# Altium footprint library Tomra_Cadstar_Footprints.PcbLib: 373 footprints (part 22 of 24)
Each footprint in its own frame and in the unit in brackets; x right, y up, seen from the top. Pads: shape width x height; smd on the part's side, far side on the other; paste and mask are expansions set on the pad; w line width, h text height; cw(c..) or ccw(c..) is an arc to the next point about the centre after c.
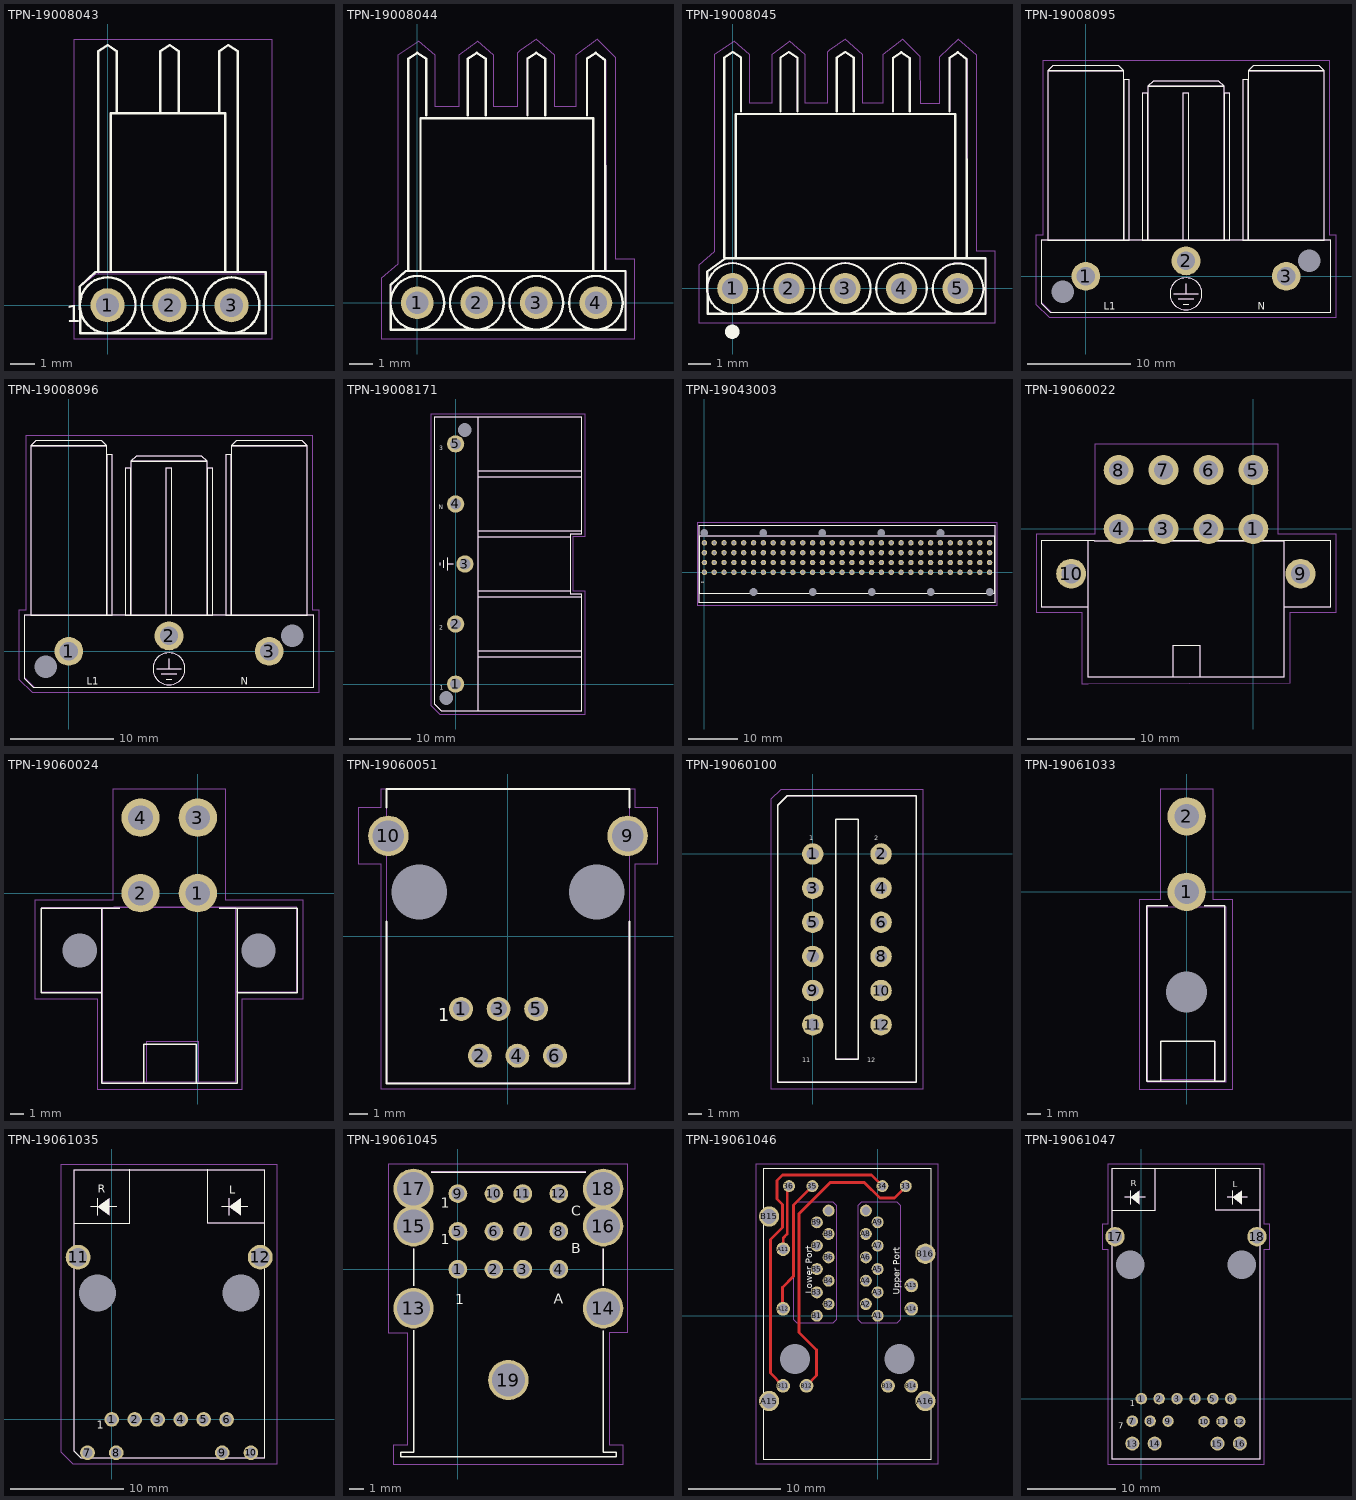
[diagram p21: the footprints below, top view; thin cyan lines are the x and y axes]

## TPN-19008043 [mm]
height 5.7
pads (3):
  round 1.4 / inner round 1.524 / far side round 1.4 hole 0.95 paste+0 mask+0: 1(0,0) 2(2.54,0) 3(5.08,0)
Top Silk:
  lines w0.1: -0.381,1.397 -0.381,10.414 0,10.668 0.381,10.414 0.381,7.874 ; 0.127,1.36 0.127,7.874 4.826,7.874 4.826,1.36 ; 2.159,7.914 2.159,10.414 2.54,10.668 2.921,10.414 2.921,7.914 ; 4.572,7.914 4.572,10.414 4.953,10.668 5.334,10.414 5.334,1.397 ; -1.143,0.762 -1.13,-1.143 6.477,-1.143 6.477,1.36 -0.495,1.36 -1.143,0.762 ; 0,-1.143 ccw(c0,0) 0,1.143 ccw(c0,0) 0,-1.143 ; 2.54,-1.143 ccw(c2.54,0) 2.54,1.143 ccw(c2.54,0) 2.54,-1.143 ; 5.08,-1.143 ccw(c5.08,0) 5.08,1.143 ccw(c5.08,0) 5.08,-1.143
  text "1" at -1.7,-0.7 h0.7
  text ".Designator" at -1.2,-2.4 h0.7
Top Assembly:
  lines w0.05: -0.381,1.314 -0.381,10.414 0,10.668 0.381,10.414 0.381,7.874 ; 0.127,1.36 0.127,7.874 4.826,7.874 4.826,1.36 ; 2.159,7.914 2.159,10.414 2.54,10.668 2.921,10.414 2.921,7.914 ; 4.572,7.914 4.572,10.414 4.953,10.668 5.334,10.414 5.334,1.314 ; 0,-1.143 ccw(c0,0) 0,1.143 ; 0,-1.143 cw(c0,0) 0,1.143 ; 0,-1.143 ccw(c0,0) 0,1.143 ; 0,-1.143 cw(c0,0) 0,1.143 ; 2.54,-1.143 ccw(c2.54,0) 2.54,1.143 ; 2.54,-1.143 cw(c2.54,0) 2.54,1.143 ; 2.54,-1.143 ccw(c2.54,0) 2.54,1.143 ; 2.54,-1.143 cw(c2.54,0) 2.54,1.143 ; 5.08,-1.143 ccw(c5.08,0) 5.08,1.143 ; 5.08,-1.143 cw(c5.08,0) 5.08,1.143 ; 5.08,-1.143 ccw(c5.08,0) 5.08,1.143 ; 5.08,-1.143 cw(c5.08,0) 5.08,1.143 ; -1.143,0.762 -0.495,1.27 6.477,1.27 6.477,-1.143 -1.13,-1.143 -1.143,0.762
  text "1" at -1.7,-0.7 h0.7
Top Placement:
  lines w0.01: -1.366,-1.386 -1.366,10.914 6.734,10.914 6.734,-1.386 -1.366,-1.386

## TPN-19008044 [mm]
pads (4):
  round 1.4 / inner round 1.524 / far side round 1.4 hole 0.95 paste+0 mask+0: 1(0,0) 2(2.54,0) 3(5.08,0) 4(7.62,0)
Top Silk:
  lines w0.1: 0.14,1.36 0.14,7.874 7.51,7.874 7.51,1.36 ; 7.239,8.001 7.239,10.414 7.62,10.668 8.01,10.36 8.019,1.431 ; -0.381,10.414 0,10.668 ; -0.381,10.414 -0.381,1.397 -0.381,10.414 ; -0.381,10.414 0,10.668 ; 0,-1.143 ccw(c0,0) 0,1.143 ; 0,-1.143 cw(c0,0) 0,1.143 ; 0,-1.143 ccw(c0,0) 0,1.143 ; 0,-1.143 cw(c0,0) 0,1.143 ; 0,10.668 0.381,10.414 ; 0,10.668 0.381,10.414 ; 0.381,10.414 0.381,8.001 0.381,10.414 ; 2.159,10.414 2.54,10.668 ; 2.159,10.414 2.159,8.001 2.159,10.414 ; 2.159,10.414 2.54,10.668 ; 2.54,-1.143 ccw(c2.54,0) 2.54,1.143 ; 2.54,-1.143 cw(c2.54,0) 2.54,1.143 ; 2.54,-1.143 ccw(c2.54,0) 2.54,1.143 ; 2.54,-1.143 cw(c2.54,0) 2.54,1.143 ; 2.54,10.668 2.921,10.414 ; 2.54,10.668 2.921,10.414 ; 2.921,10.414 2.921,8.001 2.921,10.414 ; 4.699,10.414 4.699,8.001 4.699,10.414 ; 4.699,10.414 5.08,10.668 ; 4.699,10.414 5.08,10.668 ; 5.08,-1.143 ccw(c5.08,0) 5.08,1.143 ; 5.08,-1.143 cw(c5.08,0) 5.08,1.143 ; 5.08,-1.143 ccw(c5.08,0) 5.08,1.143 ; 5.08,-1.143 cw(c5.08,0) 5.08,1.143 ; 5.08,10.668 5.461,10.414 ; 5.08,10.668 5.461,10.414 ; 5.461,10.414 5.461,8.001 5.461,10.414 ; 7.62,-1.143 ccw(c7.62,0) 7.62,1.143 ; 7.62,-1.143 cw(c7.62,0) 7.62,1.143 ; 7.62,-1.143 ccw(c7.62,0) 7.62,1.143 ; 7.62,-1.143 cw(c7.62,0) 7.62,1.143 ; -1.143,0.762 -1.13,-1.143 8.885,-1.143 8.885,1.36 -0.495,1.36 -1.143,0.762
  text ".Designator" at 0,0 h0.7
Top Assembly:
  lines w0.05: 7.26,7.985 7.26,10.398 7.641,10.652 8.031,10.344 8.04,1.415 ; -1.143,0.762 -0.495,1.36 ; -1.143,0.762 -1.13,-1.143 ; -1.143,0.762 -1.13,-1.143 ; -1.143,0.762 -0.495,1.36 ; -1.13,-1.143 8.885,-1.143 ; -1.13,-1.143 8.885,-1.143 ; -0.495,1.36 8.885,1.36 ; -0.495,1.36 8.885,1.36 ; -0.381,10.414 0,10.668 ; -0.381,10.414 -0.381,1.397 -0.381,10.414 ; -0.381,10.414 0,10.668 ; 0,-1.143 ccw(c0,0) 0,1.143 ; 0,-1.143 cw(c0,0) 0,1.143 ; 0,-1.143 ccw(c0,0) 0,1.143 ; 0,-1.143 cw(c0,0) 0,1.143 ; 0,10.668 0.381,10.414 ; 0,10.668 0.381,10.414 ; 0.14,7.874 0.14,1.36 0.14,7.874 ; 0.14,7.874 7.51,7.874 ; 0.14,7.874 7.51,7.874 ; 0.381,10.414 0.381,8.001 0.381,10.414 ; 2.159,10.414 2.54,10.668 ; 2.159,10.414 2.159,8.001 2.159,10.414 ; 2.159,10.414 2.54,10.668 ; 2.54,-1.143 ccw(c2.54,0) 2.54,1.143 ; 2.54,-1.143 cw(c2.54,0) 2.54,1.143 ; 2.54,-1.143 ccw(c2.54,0) 2.54,1.143 ; 2.54,-1.143 cw(c2.54,0) 2.54,1.143 ; 2.54,10.668 2.921,10.414 ; 2.54,10.668 2.921,10.414 ; 2.921,10.414 2.921,8.001 2.921,10.414 ; 4.699,10.414 4.699,8.001 4.699,10.414 ; 4.699,10.414 5.08,10.668 ; 4.699,10.414 5.08,10.668 ; 5.08,-1.143 ccw(c5.08,0) 5.08,1.143 ; 5.08,-1.143 cw(c5.08,0) 5.08,1.143 ; 5.08,-1.143 ccw(c5.08,0) 5.08,1.143 ; 5.08,-1.143 cw(c5.08,0) 5.08,1.143 ; 5.08,10.668 5.461,10.414 ; 5.08,10.668 5.461,10.414 ; 5.461,10.414 5.461,8.001 5.461,10.414 ; 7.51,7.874 7.51,1.36 7.51,7.874 ; 7.62,-1.143 ccw(c7.62,0) 7.62,1.143 ; 7.62,-1.143 cw(c7.62,0) 7.62,1.143 ; 7.62,-1.143 ccw(c7.62,0) 7.62,1.143 ; 7.62,-1.143 cw(c7.62,0) 7.62,1.143 ; 8.885,-1.143 8.885,1.36 ; 8.885,-1.143 8.885,1.36
  text "1" at -2.286,-0.889 h0.7
  text "1" at -2.286,-0.889 h0.7
  text "1" at -2.286,-0.889 h0.7
Top Placement:
  lines w0.01: -1.53,-1.543 9.27,-1.543 9.27,1.857 8.47,1.857 8.47,10.457 7.67,11.257 6.77,10.557 6.77,8.357 5.87,8.357 5.87,10.557 5.07,11.257 4.37,10.757 4.27,10.657 4.27,8.357 3.27,8.357 3.27,10.557 2.57,11.157 1.77,10.557 1.77,8.357 0.77,8.357 0.77,10.557 0.07,11.157 -0.83,10.557 -0.83,1.657 -1.53,1.057 -1.53,-1.543
  text "AMP" at 2.51,5.61 h0.7
  text "4" at 5.26,3.485 h0.7
  text "MTA" at 1.26,3.485 h0.7

## TPN-19008045 [mm]
pads (5):
  round 1.4 / inner round 1.524 / far side round 1.4 hole 0.95 paste+0 mask+0: 1(0,0) 2(2.54,0) 3(5.08,0) 4(7.62,0) 5(10.16,0)
Top Silk:
  region: -0.02,-2.28 -0.084,-2.28 -0.201,-2.231 -0.291,-2.141 -0.34,-2.024 -0.34,-1.896 -0.291,-1.779 -0.201,-1.689 -0.084,-1.64 -0.02,-1.64 0.044,-1.64 0.161,-1.689 0.251,-1.779 0.3,-1.896 0.3,-2.024 0.251,-2.141 0.161,-2.231 0.044,-2.28
  lines w0.1: 0.14,1.36 0.14,7.874 10.04,7.874 10.04,1.36 ; 4.699,8.001 4.699,10.414 5.08,10.668 5.461,10.414 5.461,8.001 ; 7.23,7.99 7.23,10.403 7.611,10.657 7.992,10.403 7.992,7.99 ; 9.78,7.99 9.78,10.403 10.161,10.657 10.551,10.349 10.56,1.42 ; -0.381,10.414 0,10.668 ; -0.381,10.414 -0.381,1.397 -0.381,10.414 ; -0.381,10.414 0,10.668 ; 0,-1.143 ccw(c0,0) 0,1.143 ; 0,-1.143 cw(c0,0) 0,1.143 ; 0,-1.143 ccw(c0,0) 0,1.143 ; 0,-1.143 cw(c0,0) 0,1.143 ; 0,10.668 0.381,10.414 ; 0,10.668 0.381,10.414 ; 0.381,10.414 0.381,8.001 0.381,10.414 ; 2.159,10.414 2.54,10.668 ; 2.159,10.414 2.159,8.001 2.159,10.414 ; 2.159,10.414 2.54,10.668 ; 2.54,-1.143 ccw(c2.54,0) 2.54,1.143 ; 2.54,-1.143 cw(c2.54,0) 2.54,1.143 ; 2.54,-1.143 ccw(c2.54,0) 2.54,1.143 ; 2.54,-1.143 cw(c2.54,0) 2.54,1.143 ; 2.54,10.668 2.921,10.414 ; 2.54,10.668 2.921,10.414 ; 2.921,10.414 2.921,8.001 2.921,10.414 ; 5.08,-1.143 ccw(c5.08,0) 5.08,1.143 ; 5.08,-1.143 cw(c5.08,0) 5.08,1.143 ; 5.08,-1.143 ccw(c5.08,0) 5.08,1.143 ; 5.08,-1.143 cw(c5.08,0) 5.08,1.143 ; 7.62,-1.143 ccw(c7.62,0) 7.62,1.143 ; 7.62,-1.143 cw(c7.62,0) 7.62,1.143 ; 7.62,-1.143 ccw(c7.62,0) 7.62,1.143 ; 7.62,-1.143 cw(c7.62,0) 7.62,1.143 ; -1.143,0.762 -1.127,-1.143 11.41,-1.143 11.41,1.36 -0.332,1.36 -1.143,0.762 ; 10.17,-1.153 ccw(c10.17,-0.01) 10.17,1.133 ccw(c10.17,-0.01) 10.17,-1.153
  text ".Designator" at 0,0 h0.7
Top Assembly:
  lines w0.05: 0.14,1.36 0.14,7.874 10.01,7.874 10.01,1.36 ; 7.23,7.99 7.23,10.403 7.611,10.657 7.992,10.403 7.992,7.99 ; 9.81,7.99 9.81,10.403 10.191,10.657 10.581,10.349 10.59,1.42 ; -1.143,0.762 -0.332,1.36 ; -1.143,0.762 -1.127,-1.143 ; -1.143,0.762 -1.127,-1.143 ; -1.143,0.762 -0.332,1.36 ; -1.127,-1.143 11.41,-1.143 ; -1.127,-1.143 11.41,-1.143 ; -0.381,10.414 0,10.668 ; -0.381,10.414 -0.381,1.397 -0.381,10.414 ; -0.381,10.414 0,10.668 ; -0.332,1.36 11.41,1.36 ; -0.332,1.36 11.41,1.36 ; 0,-1.143 ccw(c0,0) 0,1.143 ; 0,-1.143 cw(c0,0) 0,1.143 ; 0,-1.143 ccw(c0,0) 0,1.143 ; 0,-1.143 cw(c0,0) 0,1.143 ; 0,10.668 0.381,10.414 ; 0,10.668 0.381,10.414 ; 0.381,10.414 0.381,8.001 0.381,10.414 ; 2.159,10.414 2.54,10.668 ; 2.159,10.414 2.159,8.001 2.159,10.414 ; 2.159,10.414 2.54,10.668 ; 2.54,-1.143 ccw(c2.54,0) 2.54,1.143 ; 2.54,-1.143 cw(c2.54,0) 2.54,1.143 ; 2.54,-1.143 ccw(c2.54,0) 2.54,1.143 ; 2.54,-1.143 cw(c2.54,0) 2.54,1.143 ; 2.54,10.668 2.921,10.414 ; 2.54,10.668 2.921,10.414 ; 2.921,10.414 2.921,8.001 2.921,10.414 ; 4.699,10.414 4.699,8.001 4.699,10.414 ; 4.699,10.414 5.08,10.668 ; 4.699,10.414 5.08,10.668 ; 5.08,-1.143 ccw(c5.08,0) 5.08,1.143 ; 5.08,-1.143 cw(c5.08,0) 5.08,1.143 ; 5.08,-1.143 ccw(c5.08,0) 5.08,1.143 ; 5.08,-1.143 cw(c5.08,0) 5.08,1.143 ; 5.08,10.668 5.461,10.414 ; 5.08,10.668 5.461,10.414 ; 5.461,10.414 5.461,8.001 5.461,10.414 ; 7.62,-1.143 ccw(c7.62,0) 7.62,1.143 ; 7.62,-1.143 cw(c7.62,0) 7.62,1.143 ; 7.62,-1.143 ccw(c7.62,0) 7.62,1.143 ; 7.62,-1.143 cw(c7.62,0) 7.62,1.143 ; 11.41,-1.143 11.41,1.36 ; 11.41,-1.143 11.41,1.36 ; 10.16,-1.143 ccw(c10.16,0) 10.16,1.143 ccw(c10.16,0) 10.16,-1.143
  text "1" at -2.286,-0.889 h0.7
  text "1" at -2.286,-0.889 h0.7
  text "1" at -2.286,-0.889 h0.7
Top Placement:
  lines w0.01: -1.53,-1.543 11.85,-1.55 11.85,1.68 11.02,1.68 11.02,10.53 10.17,11.24 9.32,10.44 9.32,8.33 8.48,8.33 8.47,10.457 7.67,11.257 6.77,10.557 6.77,8.357 5.87,8.357 5.87,10.557 5.07,11.257 4.37,10.757 4.27,10.657 4.27,8.357 3.27,8.357 3.27,10.557 2.57,11.157 1.77,10.557 1.77,8.357 0.77,8.357 0.77,10.557 0.07,11.157 -0.83,10.557 -0.83,1.657 -1.53,1.057 -1.53,-1.543
  text "AMP" at 3.57,5.69 h0.7
  text "5" at 6.58,3.57 h0.7
  text "MTA" at 2.32,3.61 h0.7

## TPN-19008095 [mm]
height 13
pads (5):
  round 2.8 / inner round 1.524 / far side round 2.8 hole 1.8 paste+0 mask+0: 1(0,0) 2(9.75,1.5) 3(19.5,0)
  round 0 / inner round 1.524 / far side round 0 hole 2.2 unplated paste+0 mask+0: 4(-2.25,-1.5) 5(21.75,1.5)
Top Silk:
  lines w0.1: 8.55,-1.7 10.95,-1.7 ; 9,-2.2 10.5,-2.2 ; 9.5,-2.7 10,-2.7 ; 9.75,-1.7 9.75,-0.7 ; -3.7,20 3.7,20 ; -3.7,20 -3.7,3.5 3.7,3.5 ; -3.7,20 -3.2,20.5 3.2,20.5 3.7,20 ; -3.7,20 3.7,20 ; 3.7,3.5 3.7,20 ; 3.7,3.5 3.7,19.15 4.25,19.15 4.25,3.5 3.7,3.5 ; 6.05,3.5 6.05,18.5 ; 6.05,3.5 13.45,3.5 ; 6.05,3.5 6.05,17.8 5.5,17.8 5.5,3.5 6.05,3.5 ; 6.05,18.5 13.45,18.5 ; 6.05,18.5 6.55,19 12.95,19 13.45,18.5 ; 6.05,18.5 13.45,18.5 ; 13.45,3.5 13.45,18.5 ; 13.45,3.5 13.45,17.8 14,17.8 14,3.5 13.45,3.5 ; 15.8,3.5 15.8,19.15 15.25,19.15 15.25,3.5 15.8,3.5 ; 15.8,3.5 15.8,20 ; 15.8,3.5 23.2,3.5 23.2,20 ; 15.8,20 16.3,20.5 22.7,20.5 23.2,20 ; 15.8,20 23.2,20 ; 15.8,20 23.2,20 ; -4.35,-2.6 -4.35,3.5 23.85,3.5 23.85,-3.5 -3.45,-3.5 -4.35,-2.6 ; 9.45,3.5 9.45,17.8 10,17.8 10,3.5 9.45,3.5 ; 9.75,-3.25 cw(c9.75,-1.7) 9.75,-0.15 cw(c9.75,-1.7) 9.75,-3.25
  text "L1" at 1.75,-3.25 h0.7
  text "N" at 16.75,-3.25 h0.7
  text ".Designator" at 0,0 h0.7
Top Assembly:
  lines w0.05: 8.55,-1.7 10.95,-1.7 ; 9,-2.2 10.5,-2.2 ; 9.5,-2.7 10,-2.7 ; 9.75,-1.7 9.75,-0.7 ; -3.7,20 3.7,20 ; -3.7,20 -3.7,3.5 3.7,3.5 ; -3.7,20 -3.2,20.5 3.2,20.5 3.7,20 ; -3.7,20 3.7,20 ; 3.7,3.5 3.7,19.15 4.25,19.15 4.25,3.5 3.7,3.5 ; 3.7,3.5 3.7,20 ; 6.05,3.5 6.05,18.5 ; 6.05,3.5 13.45,3.5 ; 6.05,3.5 6.05,17.8 5.5,17.8 5.5,3.5 6.05,3.5 ; 6.05,18.5 13.45,18.5 ; 6.05,18.5 6.55,19 12.95,19 13.45,18.5 ; 6.05,18.5 13.45,18.5 ; 13.45,3.5 13.45,18.5 ; 13.45,3.5 13.45,17.8 14,17.8 14,3.5 13.45,3.5 ; 15.8,3.5 15.8,19.15 15.25,19.15 15.25,3.5 15.8,3.5 ; 15.8,3.5 15.8,20 ; 15.8,3.5 23.2,3.5 23.2,20 ; 15.8,20 16.3,20.5 22.7,20.5 23.2,20 ; 15.8,20 23.2,20 ; 15.8,20 23.2,20 ; -4.35,-2.5 -4.35,3.5 23.85,3.5 23.85,-3.5 -3.35,-3.5 -4.35,-2.5 ; 9.45,3.5 9.45,17.8 10,17.8 10,3.5 9.45,3.5 ; 9.75,-3.25 cw(c9.75,-1.7) 9.75,-0.15 cw(c9.75,-1.7) 9.75,-3.25
  text "L1" at 1.75,-3.25 h0.7
  text "N" at 16.75,-3.25 h0.7
Top Placement:
  lines w0.01: -4.85,-2.7 -3.55,-4 24.35,-4 24.35,4 23.75,4 23.75,21 -4.2,21 -4.2,4 -4.85,4 -4.85,-2.7

## TPN-19008096 [mm]
height 13
pads (5):
  round 2.8 / inner round 1.524 / far side round 2.8 hole 1.8 paste+0 mask+0: 1(0,0) 2(9.75,1.5) 3(19.5,0)
  round 0 / inner round 1.524 / far side round 0 hole 2.2 unplated paste+0 mask+0: 4(-2.25,-1.5) 5(21.75,1.5)
Top Silk:
  lines w0.1: 8.55,-1.7 10.95,-1.7 ; 9,-2.2 10.5,-2.2 ; 9.5,-2.7 10,-2.7 ; 9.75,-1.7 9.75,-0.7 ; -3.7,20 3.7,20 ; -3.7,20 -3.7,3.5 3.7,3.5 ; -3.7,20 -3.2,20.5 3.2,20.5 3.7,20 ; -3.7,20 3.7,20 ; 3.7,3.5 3.7,20 ; 3.7,3.5 3.7,19.15 4.25,19.15 4.25,3.5 3.7,3.5 ; 6.05,3.5 6.05,18.5 ; 6.05,3.5 13.45,3.5 ; 6.05,3.5 6.05,17.8 5.5,17.8 5.5,3.5 6.05,3.5 ; 6.05,18.5 13.45,18.5 ; 6.05,18.5 6.55,19 12.95,19 13.45,18.5 ; 6.05,18.5 13.45,18.5 ; 13.45,3.5 13.45,18.5 ; 13.45,3.5 13.45,17.8 14,17.8 14,3.5 13.45,3.5 ; 15.8,3.5 15.8,19.15 15.25,19.15 15.25,3.5 15.8,3.5 ; 15.8,3.5 15.8,20 ; 15.8,3.5 23.2,3.5 23.2,20 ; 15.8,20 16.3,20.5 22.7,20.5 23.2,20 ; 15.8,20 23.2,20 ; 15.8,20 23.2,20 ; -4.35,-2.6 -4.35,3.5 23.85,3.5 23.85,-3.5 -3.45,-3.5 -4.35,-2.6 ; 9.45,3.5 9.45,17.8 10,17.8 10,3.5 9.45,3.5 ; 9.75,-3.25 cw(c9.75,-1.7) 9.75,-0.15 cw(c9.75,-1.7) 9.75,-3.25
  text "L1" at 1.75,-3.25 h0.7
  text "N" at 16.75,-3.25 h0.7
  text ".Designator" at 0,0 h0.7
Top Assembly:
  lines w0.05: 8.55,-1.7 10.95,-1.7 ; 9,-2.2 10.5,-2.2 ; 9.5,-2.7 10,-2.7 ; 9.75,-1.7 9.75,-0.7 ; -3.7,20 3.7,20 ; -3.7,20 -3.7,3.5 3.7,3.5 ; -3.7,20 -3.2,20.5 3.2,20.5 3.7,20 ; -3.7,20 3.7,20 ; 3.7,3.5 3.7,19.15 4.25,19.15 4.25,3.5 3.7,3.5 ; 3.7,3.5 3.7,20 ; 6.05,3.5 6.05,18.5 ; 6.05,3.5 13.45,3.5 ; 6.05,3.5 6.05,17.8 5.5,17.8 5.5,3.5 6.05,3.5 ; 6.05,18.5 13.45,18.5 ; 6.05,18.5 6.55,19 12.95,19 13.45,18.5 ; 6.05,18.5 13.45,18.5 ; 13.45,3.5 13.45,18.5 ; 13.45,3.5 13.45,17.8 14,17.8 14,3.5 13.45,3.5 ; 15.8,3.5 15.8,19.15 15.25,19.15 15.25,3.5 15.8,3.5 ; 15.8,3.5 15.8,20 ; 15.8,3.5 23.2,3.5 23.2,20 ; 15.8,20 16.3,20.5 22.7,20.5 23.2,20 ; 15.8,20 23.2,20 ; 15.8,20 23.2,20 ; -4.35,-2.5 -4.35,3.5 23.85,3.5 23.85,-3.5 -3.35,-3.5 -4.35,-2.5 ; 9.45,3.5 9.45,17.8 10,17.8 10,3.5 9.45,3.5 ; 9.75,-3.25 cw(c9.75,-1.7) 9.75,-0.15 cw(c9.75,-1.7) 9.75,-3.25
  text "L1" at 1.75,-3.25 h0.7
  text "N" at 16.75,-3.25 h0.7
Top Placement:
  lines w0.01: -4.85,-2.7 -3.55,-4 24.35,-4 24.35,4 23.75,4 23.75,21 -4.2,21 -4.2,4 -4.85,4 -4.85,-2.7

## TPN-19008171 [mm]
height 13
pads (7):
  round 2.8 / inner round 1.524 / far side round 2.8 hole 1.8 paste+0 mask+0: 1(0,0) 2(0,9.75) 3(1.5,19.5) 4(0,29.25) 5(0,39)
  round 0 / inner round 1.524 / far side round 0 hole 2.2 unplated paste+0 mask+0: 6(1.5,41.25) 7(-1.5,-2.25)
Top Silk:
  lines w0.1: -2.6,19.3 -2.6,19.7 ; -2,18.9 -2,20.1 ; -1.4,18.5 -1.4,20.5 ; -1.4,19.5 -0.4,19.5 ; 3.55,-4.35 20.5,-4.35 ; 3.55,-4.35 3.55,4.35 20.5,4.35 20.5,-4.35 ; 3.55,-4.35 3.55,43.35 ; 3.55,43.35 20.5,43.35 ; 3.55,43.35 3.55,34.65 20.5,34.65 20.5,43.35 ; 20.5,-4.35 -2.35,-4.35 -3.5,-3.2 -3.5,43.35 20.5,43.35 ; 20.5,-4.35 20.5,14.55 18.65,14.55 18.65,24.45 20.5,24.45 20.5,43.35 ; 3.55,5.4 20.5,5.4 20.5,14.1 3.55,14.1 3.55,5.4 ; 3.55,15.15 18.65,15.15 18.65,23.85 3.55,23.85 3.55,15.15 ; 3.55,24.9 20.5,24.9 20.5,33.6 3.55,33.6 3.55,24.9
  text "3" at -2.7,38 h0.7
  text "N" at -2.75,28.4 h0.7
  text "2" at -2.7,8.8 h0.7
  text "1" at -2.6,-0.95 h0.7
  text ".Designator" at 0,0 h0.7
Top Assembly:
  lines w0.05: -2.6,19.3 -2.6,19.7 ; -2,18.9 -2,20.1 ; -1.4,18.5 -1.4,20.5 ; -1.4,19.5 -0.4,19.5 ; 3.55,-4.35 20.5,-4.35 ; 3.55,-4.35 3.55,4.35 20.5,4.35 20.5,-4.35 ; 3.55,-4.35 3.55,43.35 ; 3.55,43.35 20.5,43.35 ; 3.55,43.35 3.55,34.65 20.5,34.65 20.5,43.35 ; 20.5,-4.35 -2.35,-4.35 -3.5,-3.2 -3.5,43.35 20.5,43.35 ; 20.5,-4.35 20.5,14.55 18.65,14.55 18.65,24.45 20.5,24.45 20.5,43.35 ; 3.55,5.4 20.5,5.4 20.5,14.1 3.55,14.1 3.55,5.4 ; 3.55,15.15 18.65,15.15 18.65,23.85 3.55,23.85 3.55,15.15 ; 3.55,24.9 20.5,24.9 20.5,33.6 3.55,33.6 3.55,24.9
  text "N" at -2.75,28.4 h0.7
  text "3" at -2.7,38 h0.7
  text "2" at -2.7,8.8 h0.7
  text "1" at -2.6,-0.95 h0.7
Top Placement:
  lines w0.01: -4,-3.4 -2.55,-4.85 21,-4.85 21,15.1 19.073,15.1 19.073,24 21,24 21,43.85 -4,43.85 -4,-3.4

## TPN-19043003 [mm]
pads (130):
  round 0 / inner round 1.524 / far side round 0 hole 1.55 unplated paste+0 mask+0: 121(0,8) 122(12,8) 123(24,8) 124(36,8) 125(48,8) 126(10,-4) 127(22,-4) 128(34,-4) 129(46,-4) 130(58,-4)
  round 1.1 / inner round 1.524 / far side round 1.1 hole 0.7 paste+0 mask+0: A1(0,0) A2(2,0) A3(4,0) A4(6,0) A5(8,0) A6(10,0) A7(12,0) A8(14,0) A9(16,0) A10(18,0) A11(20,0) A12(22,0) A13(24,0) A14(26,0) A15(28,0) A16(30,0) A17(32,0) A18(34,0) A19(36,0) A20(38,0) A21(40,0) A22(42,0) A23(44,0) A24(46,0) A25(48,0) A26(50,0) A27(52,0) A28(54,0) A29(56,0) A30(58,0) B1(0,2) B2(2,2) B3(4,2) B4(6,2) B5(8,2) B6(10,2) B7(12,2) B8(14,2) B9(16,2) B10(18,2) B11(20,2) B12(22,2) B13(24,2) B14(26,2) B15(28,2) B16(30,2) B17(32,2) B18(34,2) B19(36,2) B20(38,2) B21(40,2) B22(42,2) B23(44,2) B24(46,2) B25(48,2) B26(50,2) B27(52,2) B28(54,2) B29(56,2) B30(58,2) C1(0,4) C2(2,4) C3(4,4) C4(6,4) C5(8,4) C6(10,4) C7(12,4) C8(14,4) C9(16,4) C10(18,4) C11(20,4) C12(22,4) C13(24,4) C14(26,4) C15(28,4) C16(30,4) C17(32,4) C18(34,4) C19(36,4) C20(38,4) C21(40,4) C22(42,4) C23(44,4) C24(46,4) C25(48,4) C26(50,4) C27(52,4) C28(54,4) C29(56,4) C30(58,4) D1(0,6) D2(2,6) D3(4,6) D4(6,6) D5(8,6) D6(10,6) D7(12,6) D8(14,6) D9(16,6) D10(18,6) D11(20,6) D12(22,6) D13(24,6) D14(26,6) D15(28,6) D16(30,6) D17(32,6) D18(34,6) D19(36,6) D20(38,6) D21(40,6) D22(42,6) D23(44,6) D24(46,6) D25(48,6) D26(50,6) D27(52,6) D28(54,6) D29(56,6) D30(58,6)
Top Silk:
  lines w0.1: -1,-6.2 59,-6.2 59,9.6 -1,9.6 -1,-6.2 ; -1,-4.2 59,-4.2 59,7.3 -1,7.3 -1,-4.2
  text "A1" at -0.6,-2.2 h0.35
  text ".Designator" at 0,0 h0.7
Top Assembly:
  lines w0.05: -1,-6.2 59,-6.2 59,9.6 -1,9.6 -1,-6.2 ; -1,-4.2 59,-4.2 59,7.3 -1,7.3 -1,-4.2
Top Placement:
  lines w0.01: -1.5,-6.7 59.5,-6.7 59.5,10.1 -1.5,10.1 -1.5,-6.7

## TPN-19060022 [mm]
pads (10):
  round 2.8 / inner round 1.524 / far side round 2.8 hole 1.8 paste+0 mask+0: 1(0,0) 2(-4.191,0) 3(-8.407,0) 4(-12.598,0) 5(0,5.512) 6(-4.191,5.512) 7(-8.407,5.512) 8(-12.598,5.512) 9(4.42,-4.191) 10(-17.043,-4.191)
Top Silk:
  lines w0.1: -15.443,-7.29 -19.837,-7.29 -19.837,-1.092 -14.884,-1.092 2.845,-1.092 2.845,-13.894 -15.443,-13.894 -15.443,-1.092 ; -10.312,-1.092 7.239,-1.092 7.239,-7.29 2.87,-7.29 ; -7.518,-13.843 -7.518,-10.922 -4.978,-10.922 -4.978,-13.843
  text ".Designator" at 0,0 h0.7
Top Assembly:
  lines w0.05: -15.443,-7.29 -19.837,-7.29 -19.837,-1.092 -14.884,-1.092 2.845,-1.092 2.845,-13.894 -15.443,-13.894 -15.443,-1.092 ; -10.312,-1.092 7.239,-1.092 7.239,-7.29 2.87,-7.29 ; -7.518,-13.843 -7.518,-10.922 -4.978,-10.922 -4.978,-13.843
Top Placement:
  lines w0.01: -20.337,-7.794 -20.337,-0.494 -14.843,-0.494 -14.843,7.906 2.357,7.906 2.357,-0.494 7.739,-0.494 7.739,-7.794 3.457,-7.794 3.457,-14.39 -15.465,-14.47 -16.043,-14.469 -16.043,-7.794 -20.337,-7.794

## TPN-19060024 [mm]
height 10
pads (6):
  round 2.8 / inner round 1.524 / far side round 2.8 hole 1.8 paste+0 mask+0: 1(0,0) 2(-4.191,0) 3(0,5.512) 4(-4.191,5.512)
  round 0 / inner round 1.524 / far side round 0 hole 2.5 unplated paste+0 mask+0: 5(4.445,-4.191) 6(-8.636,-4.191)
Top Silk:
  lines w0.1: -7.036,-7.29 -11.43,-7.29 -11.43,-1.092 -5.715,-1.092 ; -7.036,-1.092 -7.036,-13.894 2.87,-13.894 2.87,-1.092 1.549,-1.092 ; -3.937,-13.843 -3.937,-11.049 -0.127,-11.049 -0.127,-13.843 ; 2.87,-7.29 7.264,-7.29 7.264,-1.092 2.896,-1.092
  text ".Designator" at 0,0 h0.7
Top Assembly:
  lines w0.05: -7.036,-7.214 -11.43,-7.214 -11.43,-1.016 2.743,-1.016 2.743,-13.818 -6.96,-13.818 -6.96,-1.016 ; -6.147,-1.016 7.214,-1.016 7.214,-7.214 2.819,-7.214 ; -3.759,-13.767 -3.759,-10.846 0.051,-10.846 0.051,-13.767
Top Placement:
  lines w0.01: -11.93,-7.714 -11.93,-0.516 -6.215,-0.516 -6.215,7.612 2.024,7.612 2.024,-0.516 7.714,-0.516 7.714,-7.714 3.243,-7.714 3.243,-14.318 -7.366,-14.318 -7.366,-7.714 -11.93,-7.714

## TPN-19060051 [mm]
height 12.5
pads (10):
  round 1.3 / inner round 1.524 / far side round 1.3 hole 0.9 paste+0 mask+0: 1(-2.55,-3.95) 2(-1.53,-6.49) 3(-0.51,-3.95) 4(0.51,-6.49) 5(1.53,-3.95) 6(2.55,-6.49)
  round 0 / inner round 1.524 / far side round 0 hole 3 unplated paste+0 mask+0: 7(4.825,2.4) 8(-4.825,2.4)
  round 2.2 / inner round 1.524 / far side round 2.2 hole 1.7 paste+0 mask+0: 9(6.5,5.45) 10(-6.5,5.45)
Top Silk:
  lines w0.1: -6.6,0.8 -6.6,-8 6.6,-8 6.6,0.8 ; -6.6,7 -6.6,8 6.6,8 6.6,7
  text "1" at -3.795,-4.615 h0.7
  text ".Designator" at -6.6,8 h0.7
Top Assembly:
  lines w0.05: -6.6,0.8 -6.6,-8 ; 6.6,0.8 6.6,-8 ; -6.6,-8 6.6,-8 ; -6.6,-8 6.6,-8 ; -6.6,-8 -6.6,8 6.6,8 6.6,-8
Top Placement:
  lines w0.01: -8.1,3.9 -6.9,3.9 -6.9,-8.3 6.9,-8.3 6.9,3.9 8.1,3.9 8.1,7 6.9,7 6.9,8 -6.9,8 -6.9,7 -8.1,7 -8.1,3.9

## TPN-19060100 [mm]
height 13.5
pads (12):
  round 1.6 / inner round 1.524 / far side round 1.6 hole 0.9 paste+0 mask+0: 1(0,0) 2(5.08,0) 3(0,-2.54) 4(5.08,-2.54) 5(0,-5.08) 6(5.08,-5.08) 7(0,-7.62) 8(5.08,-7.62) 9(0,-10.16) 10(5.08,-10.16) 11(0,-12.7) 12(5.08,-12.7)
Top Silk:
  lines w0.1: -2.6,-16.979 7.7,-16.979 7.7,4.33 -1.9,4.33 -2.6,3.63 -2.6,-16.979 ; 1.7,-15.27 3.4,-15.27 3.4,2.58 1.7,2.58 1.7,-15.27
  text "1" at -0.254,1.016 h0.35
  text "2" at 4.572,1.016 h0.35
  text "12" at 4.064,-15.494 h0.35
  text "11" at -0.762,-15.494 h0.35
  text ".Designator" at 0,0.5 h0.7
Top Assembly:
  lines w0.05: -2.6,-16.979 7.7,-16.979 7.7,4.33 -1.9,4.33 -2.6,3.63 -2.6,-16.979 ; 1.7,-15.27 3.4,-15.27 3.4,2.58 1.7,2.58 1.7,-15.27
Top Placement:
  lines w0.01: -3.1,-17.479 8.2,-17.479 8.2,4.83 -2.332,4.83 -3.1,4.097 -3.1,-17.479

## TPN-19061033 [mm]
height 10
pads (3):
  round 2.8 / inner round 1.524 / far side round 2.8 hole 1.8 paste+0 mask+0: 1(0,0) 2(0,5.512)
  round 0 / inner round 1.524 / far side round 0 hole 3 unplated paste+0 mask+0: 3(0,-7.3)
Top Silk:
  lines w0.1: -1.397,-1.016 -2.921,-1.016 -2.921,-13.843 -1.905,-13.843 ; 1.27,-1.016 2.794,-1.016 2.794,-13.843 -1.905,-13.843 ; 2.032,-13.843 2.032,-10.922 -1.905,-10.922 -1.905,-13.843
  text ".Designator" at 0,0 h0.7
Top Assembly:
  lines w0.05: 2.032,-13.716 2.032,-10.922 ; 2.032,-13.716 -1.905,-13.716 -1.905,-10.922 2.032,-10.922 ; 2.032,-13.716 2.032,-10.922 ; -2.845,-13.894 2.845,-13.894 2.845,-1.1 -2.845,-1.1 -2.845,-13.894
Top Placement:
  lines w0.01: -3.445,-14.394 -3.445,-0.592 -1.945,-0.592 -1.945,7.508 1.955,7.508 1.955,-0.592 3.345,-0.592 3.345,-14.394 -3.445,-14.394

## TPN-19061035 [mm]
height 13.41
pads (14):
  round 1.3 / inner round 1.524 / far side round 1.3 hole 0.9 paste+0 mask+0: 1(0,0) 2(2.032,0) 3(4.064,0) 4(6.096,0) 5(8.128,0) 6(10.16,0) 7(-2.15,-2.95) 8(0.39,-2.95) 9(9.77,-2.95) 10(12.31,-2.95)
  round 2.2 / inner round 1.524 / far side round 2.2 hole 1.6 paste+0 mask+0: 11(-2.98,14.35) 12(13.14,14.35)
  round 0 / inner round 1.524 / far side round 0 hole 3.25 unplated paste+0 mask+0: 13(-1.27,11.18) 14(11.43,11.18)
Top Silk:
  region: -1.22,18.812 -0.204,19.574 -0.204,18.05
  region: 10.38,18.812 11.396,19.574 11.396,18.05
  lines w0.1: -3.32,17.35 1.58,17.35 1.58,22.126 ; -1.855,18.812 0.431,18.812 ; -1.22,18.05 -1.22,19.574 ; 8.48,22.126 8.48,17.35 13.48,17.35 ; 9.745,18.812 12.031,18.812 ; 10.38,18.05 10.38,19.574 ; -3.32,-2.83 -2.72,-3.43 13.48,-3.43 13.48,22.1 -3.32,22.1 -3.32,-2.83
  text "1" at -1.32,-0.85 h0.7
  text "R" at -1.22,20.05 h0.7
  text "L" at 10.38,19.95 h0.7
  text ".Designator" at 0,0 h0.7
Top Assembly:
  region: -1.22,18.812 -0.204,19.574 -0.204,18.05
  region: 10.38,18.812 11.396,19.574 11.396,18.05
  lines w0.05: -3.32,17.35 1.58,17.35 1.58,22.126 ; -1.855,18.812 0.431,18.812 ; -1.22,18.05 -1.22,19.574 ; 8.48,22.126 8.48,17.35 13.48,17.35 ; 9.745,18.812 12.031,18.812 ; 10.38,18.05 10.38,19.574 ; -3.32,-2.83 -2.72,-3.43 13.48,-3.43 13.48,22.1 -3.32,22.1 -3.32,-2.83
  text "R" at -1.22,20.05 h0.7
  text "L" at 10.38,19.95 h0.7
Top Placement:
  lines w0.01: -4.46,-2.908 -3.42,-3.948 14.59,-3.948 14.59,22.6 -4.46,22.6 -4.46,-2.908

## TPN-19061045 [mm]
height 24.8
pads (19):
  round 1.3 / inner round 1.524 / far side round 1.3 hole 0.9 paste+0 mask+0: 1(0,0) 2(2.5,0) 3(4.5,0) 4(7,0) 5(0,2.625) 6(2.5,2.625) 7(4.5,2.625) 8(7,2.625) 9(0,5.25) 10(2.5,5.25) 11(4.5,5.25) 12(7,5.25)
  round 2.8 / inner round 1.524 / far side round 2.8 hole 2.3 paste+0 mask+0: 13(-3.075,-2.7) 14(10.075,-2.7) 15(-3.075,2.985) 16(10.075,2.985) 17(-3.075,5.58) 18(10.075,5.58) 19(3.5,-7.68)
Top Silk:
  lines w0.1: -3.075,-4.225 -3.075,-12.7 -3.975,-12.7 -3.975,-13 10.975,-13 10.975,-12.7 10.075,-12.7 10.075,-4.25 ; -3.075,-1.15 -3.075,1.425 ; -1.85,6.725 8.85,6.725 ; 10.075,-1.15 10.075,1.425
  text "C" at 7.875,3.7 h0.7
  text "1" at -0.175,-2.425 h0.7
  text "B" at 7.875,1.1 h0.7
  text "1" at -1.2,1.75 h0.7
  text "A" at 6.65,-2.4 h0.7
  text "1" at -1.2,4.275 h0.7
  text ".Designator" at 0,0 h0.7
Top Assembly:
  lines w0.05: -3.075,-4.225 -3.075,-12.7 -3.975,-12.7 -3.975,-13 10.975,-13 10.975,-12.7 10.075,-12.7 10.075,-4.25 ; -3.075,-1.1 -3.075,1.475 ; -1.85,6.775 8.85,6.775 ; 10.075,-1.1 10.075,1.475
  text "USB A" at 0.55,-5.375 h0.35
Top Placement:
  lines w0.01: -4.825,-4.4 -4.825,7.3 11.775,7.3 11.775,-4.35 10.525,-4.35 10.515,-12.2 11.475,-12.2 11.475,-13.5 -4.475,-13.5 -4.475,-12.2 -3.515,-12.2 -3.515,-4.4 -4.825,-4.4

## TPN-19061046 [mm]
height 25.8
pads (38):
  round 0 / inner round 1.524 / far side round 0 hole 3.25 unplated paste+0 mask+0: 21(-9.002,-4.7) 22(2.398,-4.7)
  round 1.3 / inner round 1.524 / far side round 1.3 hole 0.9 paste+0 mask+0: 33(3.063,14.096) 34(0.523,14.096) 35(-7.097,14.096) 36(-9.637,14.096) A1(0,0) A2(-1.27,1.27) A3(0,2.54) A4(-1.27,3.81) A5(0,5.08) A6(-1.27,6.35) A7(0,7.62) A8(-1.27,8.89) A9(0,10.16) A10(-1.27,11.43) B1(-6.604,0) B2(-5.334,1.27) B3(-6.604,2.54) B4(-5.334,3.81) B5(-6.604,5.08) B6(-5.334,6.35) B7(-6.604,7.62) B8(-5.334,8.89) B9(-6.604,10.16) B10(-5.334,11.43)
  round 1.5 / inner round 1.524 / far side round 1.5 hole 1 paste+0 mask+0: A11(-10.272,7.239) A12(-10.272,0.761) A13(3.668,3.301) A14(3.668,0.761) B11(-10.272,-7.621) B12(-7.732,-7.621) B13(1.128,-7.621) B14(3.668,-7.621)
  round 2.2 / inner round 1.524 / far side round 2.2 hole 1.6 paste+0 mask+0: A15(-11.802,-9.271) A16(5.198,-9.271) B15(-11.802,10.794) B16(5.198,6.744)
Top Elec:
  lines w0.3: -10.272,-7.621 -11.652,-6.206 -11.652,8.294 -10.352,9.594 -10.352,12.094 -10.952,12.694 -10.952,14.694 -10.352,15.294 -0.652,15.294 0.546,14.096 0.523,14.096 ; -10.272,0.761 -10.352,0.761 -10.352,3.094 -9.152,4.294 -9.152,12.041 -7.097,14.096 ; -10.272,7.239 -10.252,7.239 -10.252,8.481 -9.839,8.894 -9.839,13.894 -9.637,14.096 ; -7.732,-7.621 -6.652,-6.506 -6.652,-3.706 -8.552,-1.806 -8.552,11.094 -5.152,14.494 -1.452,14.494 0.248,12.794 1.848,12.794 3.15,14.096 3.063,14.096
Top Silk:
  lines w0.1: -12.457,-15.621 5.831,-15.621 5.831,16.002 -12.457,16.002 -12.457,-15.621
  text "Lower Port" at -7.123,2.413 h0.7
  text "Upper Port" at 2.402,2.286 h0.7
  text ".Designator" at 0,0 h0.7
Top Assembly:
  lines w0.05: -9.155,-0.381 -8.774,-0.762 -4.837,-0.762 -4.456,-0.381 -4.456,11.938 -4.837,12.319 -8.774,12.319 -9.155,11.938 -9.155,-0.381 ; -2.17,-0.381 -1.789,-0.762 2.148,-0.762 2.529,-0.381 2.529,11.938 2.148,12.319 -1.789,12.319 -2.17,11.938 -2.17,-0.381
Top Placement:
  lines w0.01: -13.252,-16.121 6.593,-16.121 6.593,16.502 -13.252,16.502 -13.252,-16.121

## TPN-19061047 [mm]
height 15.2
pads (20):
  round 1.3 / inner round 1.524 / far side round 1.3 hole 0.9 paste+0 mask+0: 1(0,0) 2(2.032,0) 3(4.064,0) 4(6.096,0) 5(8.128,0) 6(10.16,0) 7(-1.02,-2.55) 8(1.012,-2.55) 9(3.044,-2.55) 10(7.13,-2.6) 11(9.162,-2.6) 12(11.194,-2.6)
  round 1.6 / inner round 1.524 / far side round 1.6 hole 1.2 paste+0 mask+0: 13(-1.02,-5.1) 14(1.52,-5.1) 15(8.654,-5.1) 16(11.194,-5.1)
  round 2.2 / inner round 1.524 / far side round 2.2 hole 1.6 paste+0 mask+0: 17(-2.98,18.4) 18(13.14,18.4)
  round 0 / inner round 1.524 / far side round 0 hole 3.25 unplated paste+0 mask+0: 19(-1.27,15.23) 20(11.43,15.23)
Top Silk:
  region: -1.22,22.862 -0.204,23.624 -0.204,22.1
  region: 10.38,22.862 11.396,23.624 11.396,22.1
  lines w0.1: -3.32,21.4 1.58,21.4 1.58,26.176 ; -1.855,22.862 0.431,22.862 ; -1.22,22.1 -1.22,23.624 ; 8.48,26.176 8.48,21.4 13.48,21.4 ; 9.745,22.862 12.031,22.862 ; 10.38,22.1 10.38,23.624 ; -3.32,-6.9 13.48,-6.9 13.48,26.15 -3.32,26.15 -3.32,-6.9
  text "R" at -1.22,24.1 h0.7
  text "L" at 10.38,24 h0.7
  text "1" at -1.32,-0.85 h0.7
  text "7" at -2.62,-3.4 h0.7
  text ".Designator" at 0,0 h0.7
Top Assembly:
  region: -1.22,22.862 -0.204,23.624 -0.204,22.1
  region: 10.38,22.862 11.396,23.624 11.396,22.1
  lines w0.05: -3.32,21.4 1.58,21.4 1.58,26.176 ; -1.855,22.862 0.431,22.862 ; -1.22,22.1 -1.22,23.624 ; 8.48,26.176 8.48,21.4 13.48,21.4 ; 9.745,22.862 12.031,22.862 ; 10.38,22.1 10.38,23.624 ; -3.32,-6.9 13.48,-6.9 13.48,26.15 -3.32,26.15 -3.32,-6.9
  text "R" at -1.22,24.1 h0.7
  text "L" at 10.38,24 h0.7
Top Placement:
  lines w0.01: -4.42,16.985 -4.42,19.8 -3.825,19.8 -3.82,26.65 13.98,26.65 13.98,19.8 14.58,19.8 14.58,16.985 13.955,16.985 13.98,-7.418 -3.82,-7.418 -3.82,16.985 -4.42,16.985